# Altium footprint library Connectors Molex.PcbLib: 105 footprints (part 3 of 7)
Each footprint in its own frame and in the unit in brackets; x right, y up, seen from the top. Pads: shape width x height; smd on the part's side, far side on the other; paste and mask are expansions set on the pad; w line width, h text height; cw(c..) or ccw(c..) is an arc to the next point about the centre after c.
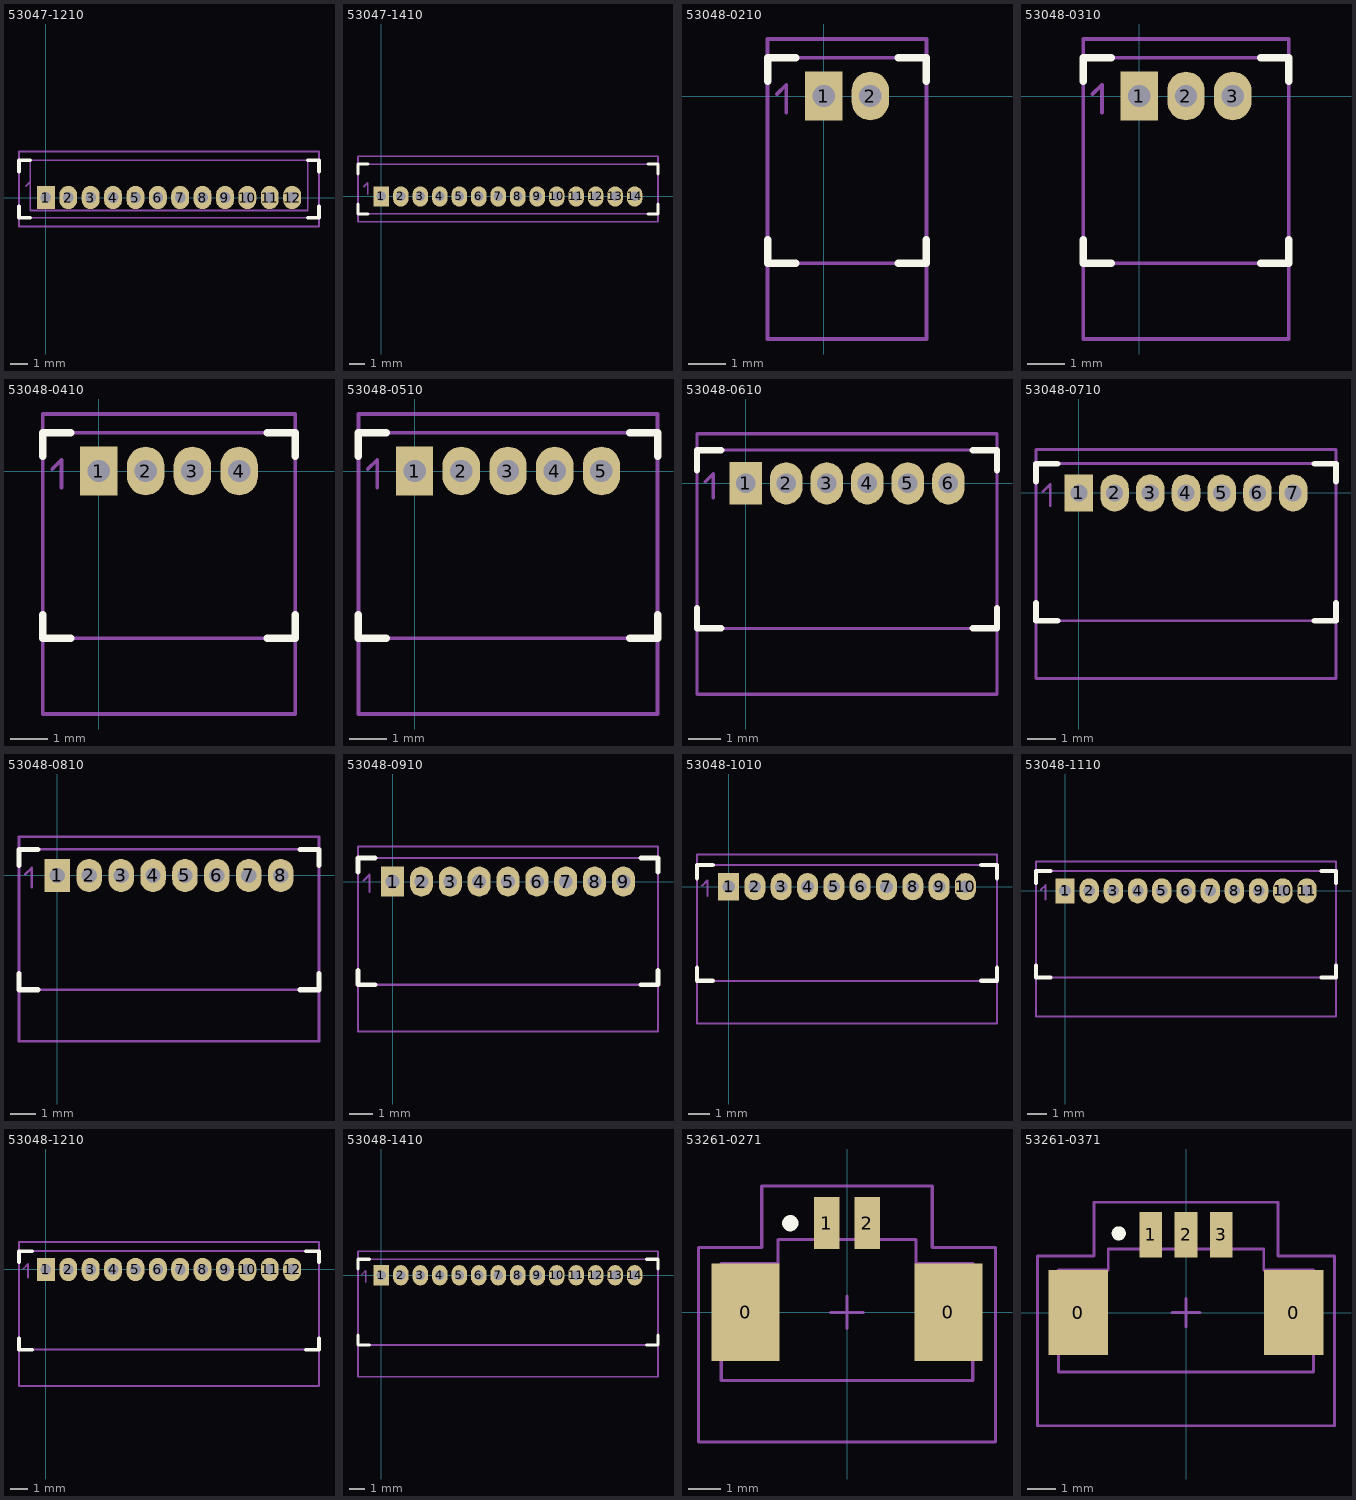
[diagram p2: the footprints below, top view; thin cyan lines are the x and y axes]

## 53047-1210 [mm] "PicoBlade™ 53047-1210"
height 4.7
pads (12):
  rect 1x1.3 hole 0.6: 1(0,0)
  oval 1x1.3 hole 0.6: 2(1.25,0) 3(2.5,0) 4(3.75,0) 5(5,0) 6(6.25,0) 7(7.5,0) 8(8.75,0) 9(10,0) 10(11.25,0) 11(12.5,0) 12(13.75,0)
Top Overlay:
  lines w0.2: -1.5,-0.5 -1.5,-1.125 -0.875,-1.125 ; -1.5,1.45 -1.5,2.075 -0.875,2.075 ; 14.625,-1.125 15.25,-1.125 15.25,-0.5 ; 14.625,2.075 15.25,2.075 15.25,1.45
Top Solder:
  rectangle: 0,-0.75 13.75,0.75
Bottom Solder:
  region: 13.75,0.75 0,0.75 0,-0.75 13.75,-0.75
Mechanical 1:
  lines w0.1: -0.875,-0.725 -0.875,2.075 14.625,2.075 14.625,-0.725 -0.875,-0.725
Mechanical 13:
  lines w0.1: -1.125,0.625 -0.875,0.875 -0.875,0.125 ; -1.5,-1.125 -1.5,2.075 15.25,2.075 15.25,-1.125 -1.5,-1.125
  text ".Designator" at 4.6,1 h1.5
Mechanical 15:
  lines w0.1: -1.5,-1.625 15.25,-1.625 15.25,2.575 -1.5,2.575 -1.5,-1.625
3D body "530471210.stp": height 4.2, standoff -2.3, extent -1.5,-1.125 15.25,2.075

## 53047-1410 [mm] "PicoBlade™ 53047"
height 4.7
pads (14):
  rect 1x1.3 hole 0.6: 1(0,0)
  oval 1x1.3 hole 0.6: 2(1.25,0) 3(2.5,0) 4(3.75,0) 5(5,0) 6(6.25,0) 7(7.5,0) 8(8.75,0) 9(10,0) 10(11.25,0) 11(12.5,0) 12(13.75,0) 13(15,0) 14(16.25,0)
Top Overlay:
  lines w0.2: -1.5,-0.5 -1.5,-1.125 -0.875,-1.125 ; -1.5,1.45 -1.5,2.075 -0.875,2.075 ; 17.125,-1.125 17.75,-1.125 17.75,-0.5 ; 17.125,2.075 17.75,2.075 ; 17.75,1.45 17.75,2.075
Top Solder:
  rectangle: 0,-0.75 16.25,0.75
Bottom Solder:
  region: 16.25,0.75 0,0.75 0,-0.75 16.25,-0.75
Mechanical 13:
  lines w0.1: -1.125,0.625 -0.875,0.875 -0.875,0.125 ; -1.5,-1.125 17.75,-1.125 17.75,2.075 -1.5,2.075 -1.5,-1.125
  text ".Designator" at 7.2,1 h1.5
Mechanical 15:
  lines w0.1: -1.5,-1.625 -1.5,2.575 17.75,2.575 17.75,-1.625 -1.5,-1.625
3D body "530471410.stp": height 4.2, standoff -2.3, extent -1.5,-1.125 17.75,2.075

## 53048-0210 [mm] "PicoBlade™ 53048-0210"
height 4.7
pads (2):
  rect 1x1.3 hole 0.6: 1(0,0)
  oval 1x1.3 hole 0.6: 2(1.25,0)
Top Overlay:
  lines w0.2: -1.5,-3.85 -1.5,-4.475 -0.75,-4.475 ; -1.5,0.4 -1.5,1.025 -0.75,1.025 ; 2,-4.475 2.75,-4.475 2.75,-3.85 ; 2,1.025 2.75,1.025 2.75,0.4
Top Solder:
  rectangle: 0,-0.75 1.25,0.75
Bottom Solder:
  region: 1.25,0.75 0,0.75 0,-0.75 1.25,-0.75
Mechanical 13:
  lines w0.1: -1.25,0.05 -1,0.3 -1,-0.45 ; -1.5,-4.475 -1.5,1.025 2.75,1.025 2.75,-4.475 -1.5,-4.475
  text ".Designator" at -1.075,-2.275 h1.5
Mechanical 15:
  lines w0.1: -1.5,-6.5 2.75,-6.5 2.75,1.525 -1.5,1.525 -1.5,-6.5
3D body "530480210.stp": height 3.5, standoff -2.3, extent -1.5,-4.475 2.75,1.025

## 53048-0310 [mm] "PicoBlade™ 53048-0310"
height 3.5
pads (3):
  rect 1x1.3 hole 0.6: 1(0,0)
  oval 1x1.3 hole 0.6: 2(1.25,0) 3(2.5,0)
Top Overlay:
  lines w0.2: -1.5,-3.85 -1.5,-4.475 -0.75,-4.475 ; -1.5,0.4 -1.5,1.025 -0.75,1.025 ; 3.25,-4.475 4,-4.475 4,-3.85 ; 3.25,1.025 4,1.025 4,0.4
Top Solder:
  rectangle: 0,-0.75 2.5,0.75
Bottom Solder:
  region: 2.5,0.75 0,0.75 0,-0.75 2.5,-0.75
Mechanical 13:
  lines w0.1: -1.25,0.05 -1,0.3 -1,-0.45 ; -1.5,-4.475 4,-4.475 4,1.025 -1.5,1.025 -1.5,-4.475
  text ".Designator" at 0.3,-2.475 h1.5
Mechanical 15:
  lines w0.1: -1.5,-6.5 -1.5,1.525 4,1.525 4,-6.5 -1.5,-6.5
3D body "530480310.stp": height 3.5, standoff -2.3, extent -1.5,-4.475 4,1.025

## 53048-0410 [mm] "PicoBlade™ 53048-0410"
height 3.5
pads (4):
  rect 1x1.3 hole 0.6: 1(0,0)
  oval 1x1.3 hole 0.6: 2(1.25,0) 3(2.5,0) 4(3.75,0)
Top Overlay:
  lines w0.2: -1.5,-3.85 -1.5,-4.475 -0.75,-4.475 ; -1.5,0.4 -1.5,1.025 -0.75,1.025 ; 4.5,-4.475 5.25,-4.475 5.25,-3.85 ; 4.5,1.025 5.25,1.025 5.25,0.4
Top Solder:
  rectangle: 0,-0.75 3.75,0.75
Bottom Solder:
  region: 3.75,0.75 0,0.75 0,-0.75 3.75,-0.75
Mechanical 13:
  lines w0.1: -1.25,0.05 -1,0.3 -1,-0.45 ; -1.5,-4.475 -1.5,1.025 5.25,1.025 5.25,-4.475 -1.5,-4.475
  text ".Designator" at 0.3,-2.475 h1.5
Mechanical 15:
  lines w0.1: -1.5,-6.5 5.25,-6.5 5.25,1.525 -1.5,1.525 -1.5,-6.5
3D body "530480410.stp": height 3.5, standoff -2.3, extent -1.5,-4.475 5.25,1.025

## 53048-0510 [mm] "PicoBlade™ 53048-0510"
height 3.5
pads (5):
  rect 1x1.3 hole 0.6: 1(0,0)
  oval 1x1.3 hole 0.6: 2(1.25,0) 3(2.5,0) 4(3.75,0) 5(5,0)
Top Overlay:
  lines w0.2: -1.5,-3.85 -1.5,-4.475 -0.75,-4.475 ; -1.5,0.4 -1.5,1.025 -0.75,1.025 ; 5.75,-4.475 6.5,-4.475 6.5,-3.85 ; 5.75,1.025 6.5,1.025 6.5,0.4
Top Solder:
  rectangle: 0,-0.75 5,0.75
Bottom Solder:
  region: 5,0.75 0,0.75 0,-0.75 5,-0.75
Mechanical 13:
  lines w0.1: -1.25,0.05 -1,0.3 -1,-0.45 ; -1.5,-4.475 -1.5,1.025 6.5,1.025 6.5,-4.475 -1.5,-4.475
  text ".Designator" at 1,-2.5 h1.5
Mechanical 15:
  lines w0.1: -1.5,-6.5 6.5,-6.5 6.5,1.525 -1.5,1.525 -1.5,-6.5
3D body "530480510.stp": height 3.5, standoff -2.3, extent -1.5,-4.475 6.5,1.025

## 53048-0610 [mm] "PicoBlade™ 53048-0610"
height 3.5
pads (6):
  rect 1x1.3 hole 0.6: 1(0,0)
  oval 1x1.3 hole 0.6: 2(1.25,0) 3(2.5,0) 4(3.75,0) 5(5,0) 6(6.25,0)
Top Overlay:
  lines w0.2: -1.5,-3.85 -1.5,-4.475 -0.75,-4.475 ; -1.5,0.4 -1.5,1.025 -0.75,1.025 ; 7,-4.475 7.75,-4.475 7.75,-3.85 ; 7,1.025 7.75,1.025 7.75,0.4
Top Solder:
  rectangle: 0,-0.75 6.25,0.75
Bottom Solder:
  region: 6.25,0.75 0,0.75 0,-0.75 6.25,-0.75
Mechanical 13:
  lines w0.1: -1.25,0.05 -1,0.3 -1,-0.45 ; -1.5,-4.475 -1.5,1.025 7.75,1.025 7.75,-4.475 -1.5,-4.475
  text ".Designator" at 1.25,-2.475 h1.5
Mechanical 15:
  lines w0.1: -1.5,-6.5 7.75,-6.5 7.75,1.525 -1.5,1.525 -1.5,-6.5
3D body "530480610.stp": height 3.5, standoff -2.3, extent -1.5,-4.475 7.75,1.025

## 53048-0710 [mm] "PicoBlade™ 53048-0710"
height 3.5
pads (7):
  rect 1x1.3 hole 0.6: 1(0,0)
  oval 1x1.3 hole 0.6: 2(1.25,0) 3(2.5,0) 4(3.75,0) 5(5,0) 6(6.25,0) 7(7.5,0)
Top Overlay:
  lines w0.2: -1.5,-3.85 -1.5,-4.475 -0.75,-4.475 ; -1.5,0.4 -1.5,1.025 -0.75,1.025 ; 8.25,-4.475 9,-4.475 9,-3.85 ; 8.25,1.025 9,1.025 9,0.4
Top Solder:
  rectangle: 0,-0.75 7.5,0.75
Bottom Solder:
  region: 7.5,0.75 0,0.75 0,-0.75 7.5,-0.75
Mechanical 13:
  lines w0.1: -1.25,0.05 -1,0.3 -1,-0.45 ; -1.5,-4.475 -1.5,1.025 9,1.025 9,-4.475 -1.5,-4.475
  text ".Designator" at 1.825,-2.55 h1.5
Mechanical 15:
  lines w0.1: -1.5,-6.5 9,-6.5 9,1.525 -1.5,1.525 -1.5,-6.5
3D body "530480710.stp": height 3.5, standoff -2.3, extent -1.5,-4.475 9,1.025

## 53048-0810 [mm] "PicoBlade™ 53048-0810"
height 3.5
pads (8):
  rect 1x1.3 hole 0.6: 1(0,0)
  oval 1x1.3 hole 0.6: 2(1.25,0) 3(2.5,0) 4(3.75,0) 5(5,0) 6(6.25,0) 7(7.5,0) 8(8.75,0)
Top Overlay:
  lines w0.2: -1.5,-3.85 -1.5,-4.475 -0.75,-4.475 ; -1.5,0.4 -1.5,1.025 -0.75,1.025 ; 9.5,-4.475 10.25,-4.475 10.25,-3.85 ; 9.5,1.025 10.25,1.025 10.25,0.4
Top Solder:
  rectangle: 0,-0.75 8.75,0.75
Bottom Solder:
  region: 8.75,0.75 0,0.75 0,-0.75 8.75,-0.75
Mechanical 13:
  lines w0.1: -1.25,0.05 -1,0.3 -1,-0.45 ; -1.5,-4.475 -1.5,1.025 10.25,1.025 10.25,-4.475 -1.5,-4.475
  text ".Designator" at 2.525,-2.5 h1.5
Mechanical 15:
  lines w0.1: -1.5,-6.5 10.25,-6.5 10.25,1.525 -1.5,1.525 -1.5,-6.5
3D body "530480810.stp": height 3.5, standoff -2.3, extent -1.5,-4.475 10.25,1.025

## 53048-0910 [mm] "PicoBlade™ 53048-0910"
height 3.5
pads (9):
  rect 1x1.3 hole 0.6: 1(0,0)
  oval 1x1.3 hole 0.6: 2(1.25,0) 3(2.5,0) 4(3.75,0) 5(5,0) 6(6.25,0) 7(7.5,0) 8(8.75,0) 9(10,0)
Top Overlay:
  lines w0.2: -1.5,-3.85 -1.5,-4.475 -0.75,-4.475 ; -1.5,0.4 -1.5,1.025 -0.75,1.025 ; 10.75,-4.475 11.5,-4.475 11.5,-3.85 ; 10.75,1.025 11.5,1.025 11.5,0.4
Top Solder:
  rectangle: 0,-0.75 10,0.75
Bottom Solder:
  region: 10,0.75 0,0.75 0,-0.75 10,-0.75
Mechanical 13:
  lines w0.1: -1.25,0.05 -1,0.3 -1,-0.45 ; -1.5,-4.475 -1.5,1.025 11.5,1.025 11.5,-4.475 -1.5,-4.475
  text ".Designator" at 3.275,-2.7 h1.5
Mechanical 15:
  lines w0.1: -1.5,-6.5 11.5,-6.5 11.5,1.525 -1.5,1.525 -1.5,-6.5
3D body "530480910.stp": height 3.5, standoff -2.3, extent -1.5,-4.475 11.5,1.025

## 53048-1010 [mm] "PicoBlade™ 53048-1010"
height 3.5
pads (10):
  rect 1x1.3 hole 0.6: 1(0,0)
  oval 1x1.3 hole 0.6: 2(1.25,0) 3(2.5,0) 4(3.75,0) 5(5,0) 6(6.25,0) 7(7.5,0) 8(8.75,0) 9(10,0) 10(11.25,0)
Top Overlay:
  lines w0.2: -1.5,-3.85 -1.5,-4.475 -0.75,-4.475 ; -1.5,0.4 -1.5,1.025 -0.75,1.025 ; 12,-4.475 12.75,-4.475 12.75,-3.85 ; 12,1.025 12.75,1.025 12.75,0.4
Top Solder:
  rectangle: 0,-0.75 11.25,0.75
Bottom Solder:
  region: 11.25,0.75 0,0.75 0,-0.75 11.25,-0.75
Mechanical 13:
  lines w0.1: -1.25,0.05 -1,0.3 -1,-0.45 ; -1.5,-4.475 -1.5,1.025 12.75,1.025 12.75,-4.475 -1.5,-4.475
  text ".Designator" at 3.65,-2.725 h1.5
Mechanical 15:
  lines w0.1: -1.5,-6.5 12.75,-6.5 12.75,1.525 -1.5,1.525 -1.5,-6.5
3D body "530481010.stp": height 3.5, standoff -2.3, extent -1.5,-4.475 12.75,1.025

## 53048-1110 [mm] "PicoBlade™ 53048-1110"
height 3.5
pads (11):
  rect 1x1.3 hole 0.6: 1(0,0)
  oval 1x1.3 hole 0.6: 2(1.25,0) 3(2.5,0) 4(3.75,0) 5(5,0) 6(6.25,0) 7(7.5,0) 8(8.75,0) 9(10,0) 10(11.25,0) 11(12.5,0)
Top Overlay:
  lines w0.2: -1.5,-3.85 -1.5,-4.475 -0.75,-4.475 ; -1.5,0.4 -1.5,1.025 -0.75,1.025 ; 13.25,-4.475 14,-4.475 14,-3.85 ; 13.25,1.025 14,1.025 14,0.4
Top Solder:
  rectangle: 0,-0.75 12.5,0.75
Bottom Solder:
  region: 12.5,0.75 0,0.75 0,-0.75 12.5,-0.75
Mechanical 13:
  lines w0.1: -1.25,0.05 -1,0.3 -1,-0.45 ; -1.5,-4.475 -1.5,1.025 14,1.025 14,-4.475 -1.5,-4.475
  text ".Designator" at 4.75,-2.5 h1.5
Mechanical 15:
  lines w0.1: -1.5,-6.5 14,-6.5 14,1.525 -1.5,1.525 -1.5,-6.5
3D body "530481110.stp": height 3.5, standoff -2.3, extent -1.5,-4.475 14,1.025

## 53048-1210 [mm] "PicoBlade™ 53048-1210"
height 3.5
pads (12):
  rect 1x1.3 hole 0.6: 1(0,0)
  oval 1x1.3 hole 0.6: 2(1.25,0) 3(2.5,0) 4(3.75,0) 5(5,0) 6(6.25,0) 7(7.5,0) 8(8.75,0) 9(10,0) 10(11.25,0) 11(12.5,0) 12(13.75,0)
Top Overlay:
  lines w0.2: -1.5,-3.85 -1.5,-4.475 -0.75,-4.475 ; -1.5,0.4 -1.5,1.025 -0.75,1.025 ; 14.5,-4.475 15.25,-4.475 15.25,-3.85 ; 14.5,1.025 15.25,1.025 15.25,0.4
Top Solder:
  rectangle: 0,-0.75 13.75,0.75
Bottom Solder:
  region: 13.75,0.75 0,0.75 0,-0.75 13.75,-0.75
Mechanical 13:
  lines w0.1: -1.25,0.05 -1,0.3 -1,-0.45 ; -1.5,-4.475 15.25,-4.475 15.25,1.025 -1.5,1.025 -1.5,-4.475
  text ".Designator" at 5.15,-2.6 h1.5
Mechanical 15:
  lines w0.1: -1.5,-6.5 -1.5,1.525 15.25,1.525 15.25,-6.5 -1.5,-6.5
3D body "530481210.stp": height 3.5, standoff -2.3, extent -1.5,-4.475 15.25,1.025

## 53048-1410 [mm] "PicoBlade™ 53048"
height 3.5
pads (14):
  rect 1x1.3 hole 0.6: 1(0,0)
  oval 1x1.3 hole 0.6: 2(1.25,0) 3(2.5,0) 4(3.75,0) 5(5,0) 6(6.25,0) 7(7.5,0) 8(8.75,0) 9(10,0) 10(11.25,0) 11(12.5,0) 12(13.75,0) 13(15,0) 14(16.25,0)
Top Overlay:
  lines w0.2: -1.5,-3.85 -1.5,-4.475 -0.75,-4.475 ; -1.5,0.4 -1.5,1.025 -0.75,1.025 ; 17,-4.475 17.75,-4.475 17.75,-3.85 ; 17,1.025 17.75,1.025 17.75,0.4
Top Solder:
  rectangle: 0,-0.75 16.25,0.75
Bottom Solder:
  region: 16.25,0.75 0,0.75 0,-0.75 16.25,-0.75
Mechanical 13:
  lines w0.1: -1.25,0.05 -1,0.3 -1,-0.45 ; -1.5,-4.475 17.75,-4.475 17.75,1.025 -1.5,1.025 -1.5,-4.475
  text ".Designator" at 5.15,-2.6 h1.5
Mechanical 15:
  lines w0.1: -1.5,-6.5 -1.5,1.525 17.75,1.525 17.75,-6.5 -1.5,-6.5
3D body "530481410.stp": height 3.5, standoff -2.3, extent -1.5,-4.475 17.75,1.025

## 53261-0271 [mm] "PicoBlade™ 53261-0271"
height 3.4
pads (4):
  rect 2.1x3 smd: 0(-3.125,0) 0(3.125,0)
  rect 0.8x1.6 smd: 1(-0.625,2.75) 2(0.625,2.75)
Top Overlay:
  circle w0.25: c-1.75,2.75 r0.125
Mechanical 1:
  lines w0.1: -3.875,-2.1 -3.875,1.5 -2.125,1.5 -2.125,2.25 2.125,2.25 2.125,1.5 3.875,1.5 3.875,-2.1 -3.875,-2.1
Mechanical 13:
  lines w0.1: -3.375,0.5 -2.875,1 -2.875,-0.75 ; -0.875,2.25 -0.875,3.25 -0.375,3.25 -0.375,2.25 ; 0.375,2.25 0.375,3.25 0.875,3.25 0.875,2.25 ; -3.875,-2.1 -3.875,1.5 -2.125,1.5 -2.125,2.25 2.125,2.25 2.125,1.5 3.875,1.5 3.875,-2.1 -3.875,-2.1
  text ".Designator" at -1.85,-0.35 h1.5
Mechanical 15:
  lines w0.1: -0.5,0 0.5,0 ; 0,-0.5 0,0.5 ; -4.575,-4 -4.575,2 -2.625,2 -2.625,3.9 2.625,3.9 2.625,2 4.575,2 4.575,-4 -4.575,-4
3D body "532610271.stp": height 3.4, standoff 0, extent -3.825,-2.1 3.825,3.1

## 53261-0371 [mm] "PicoBlade™ 553261-0371"
height 3.4
pads (5):
  rect 2.1x3 smd: 0(-3.8,0) 0(3.8,0)
  rect 0.8x1.6 smd: 1(-1.25,2.75) 2(0,2.75) 3(1.25,2.75)
Top Overlay:
  circle w0.25: c-2.375,2.798 r0.125
Mechanical 1:
  lines w0.1: -4.5,-2.1 -4.5,1.5 -2.75,1.5 -2.75,2.25 2.75,2.25 2.75,1.5 4.5,1.5 4.5,-2.1 -4.5,-2.1
Mechanical 13:
  lines w0.1: -3.5,-0.75 -3.5,1 -4,0.5 ; -1.5,2.25 -1.5,3.25 -1,3.25 -1,2.25 ; -0.25,2.25 -0.25,3.25 0.25,3.25 0.25,2.25 ; 1,2.25 1,3.25 1.5,3.25 1.5,2.25 ; -4,0.5 -4,0.5 ; -4.5,-2.1 -4.5,1.5 -2.75,1.5 -2.75,2.25 2.75,2.25 2.75,1.5 4.5,1.5 4.5,-2.1 -4.5,-2.1
  text ".Designator" at -2.175,-0.2 h1.5
Mechanical 15:
  lines w0.1: -0.5,0 0.5,0 ; 0,-0.5 0,0.5 ; -5.25,-4 -5.25,2 -3.25,2 -3.25,3.9 -2.85,3.9 3.25,3.9 3.25,2 5.25,2 5.25,-4 -5.25,-4
3D body "532610371.stp": height 3.4, standoff 0, extent -4.45,-2.1 4.45,3.1